# Altium schematic symbol library 6-Connectors 连接器.端子.SchLib: 402 symbols (part 2 of 5) (continued)
## Connector 240 Female (4x60) + 3x4 GND (continued)
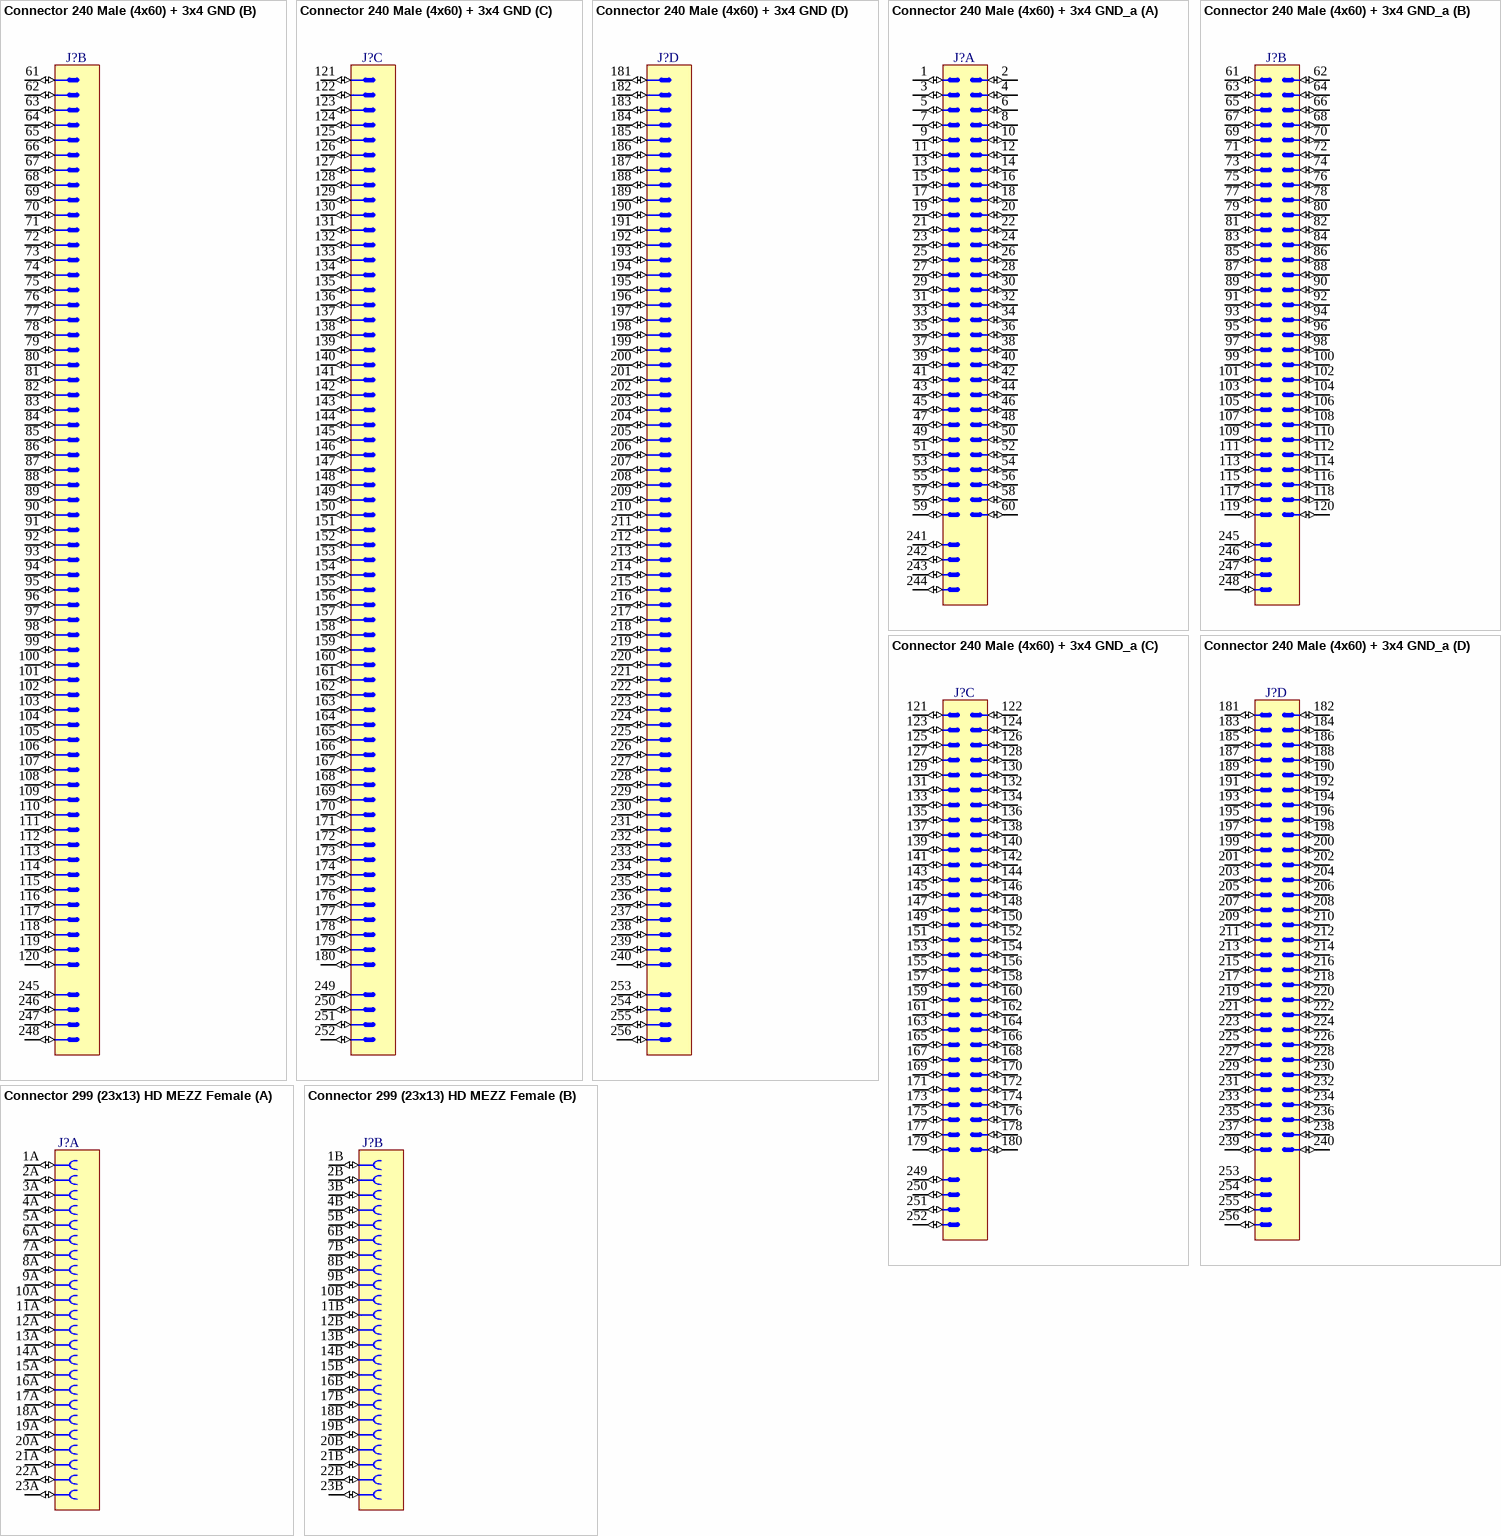
[diagram p20: symbols Connector 240 Male (4x60) + 3x4 GND to Connector 299 (23x13) HD MEZZ Female]

## Connector 240 Male (4x60) + 3x4 GND
designator J?
Connector 240 Male (4x60) + 3x4 GND
part A pins: 1 (io), 2 (io), 3 (io), 4 (io), 5 (io), 6 (io), 7 (io), 8 (io), 9 (io), 10 (io), 11 (io), 12 (io), 13 (io), 14 (io), 15 (io), 16 (io), 17 (io), 18 (io), 19 (io), 20 (io), 21 (io), 22 (io), 23 (io), 24 (io), 25 (io), 26 (io), 27 (io), 28 (io), 29 (io), 30 (io), 31 (io), 32 (io), 33 (io), 34 (io), 35 (io), 36 (io), 37 (io), 38 (io), 39 (io), 40 (io), 41 (io), 42 (io), 43 (io), 44 (io), 45 (io), 46 (io), 47 (io), 48 (io), 49 (io), 50 (io), 51 (io), 52 (io), 53 (io), 54 (io), 55 (io), 56 (io), 57 (io), 58 (io), 59 (io), 60 (io), 241 (io), 242 (io), 243 (io), 244 (io)
part B pins: 61 (io), 62 (io), 63 (io), 64 (io), 65 (io), 66 (io), 67 (io), 68 (io), 69 (io), 70 (io), 71 (io), 72 (io), 73 (io), 74 (io), 75 (io), 76 (io), 77 (io), 78 (io), 79 (io), 80 (io), 81 (io), 82 (io), 83 (io), 84 (io), 85 (io), 86 (io), 87 (io), 88 (io), 89 (io), 90 (io), 91 (io), 92 (io), 93 (io), 94 (io), 95 (io), 96 (io), 97 (io), 98 (io), 99 (io), 100 (io), 101 (io), 102 (io), 103 (io), 104 (io), 105 (io), 106 (io), 107 (io), 108 (io), 109 (io), 110 (io), 111 (io), 112 (io), 113 (io), 114 (io), 115 (io), 116 (io), 117 (io), 118 (io), 119 (io), 120 (io), 245 (io), 246 (io), 247 (io), 248 (io)
part C pins: 121 (io), 122 (io), 123 (io), 124 (io), 125 (io), 126 (io), 127 (io), 128 (io), 129 (io), 130 (io), 131 (io), 132 (io), 133 (io), 134 (io), 135 (io), 136 (io), 137 (io), 138 (io), 139 (io), 140 (io), 141 (io), 142 (io), 143 (io), 144 (io), 145 (io), 146 (io), 147 (io), 148 (io), 149 (io), 150 (io), 151 (io), 152 (io), 153 (io), 154 (io), 155 (io), 156 (io), 157 (io), 158 (io), 159 (io), 160 (io), 161 (io), 162 (io), 163 (io), 164 (io), 165 (io), 166 (io), 167 (io), 168 (io), 169 (io), 170 (io), 171 (io), 172 (io), 173 (io), 174 (io), 175 (io), 176 (io), 177 (io), 178 (io), 179 (io), 180 (io), 249 (io), 250 (io), 251 (io), 252 (io)
part D pins: 181 (io), 182 (io), 183 (io), 184 (io), 185 (io), 186 (io), 187 (io), 188 (io), 189 (io), 190 (io), 191 (io), 192 (io), 193 (io), 194 (io), 195 (io), 196 (io), 197 (io), 198 (io), 199 (io), 200 (io), 201 (io), 202 (io), 203 (io), 204 (io), 205 (io), 206 (io), 207 (io), 208 (io), 209 (io), 210 (io), 211 (io), 212 (io), 213 (io), 214 (io), 215 (io), 216 (io), 217 (io), 218 (io), 219 (io), 220 (io), 221 (io), 222 (io), 223 (io), 224 (io), 225 (io), 226 (io), 227 (io), 228 (io), 229 (io), 230 (io), 231 (io), 232 (io), 233 (io), 234 (io), 235 (io), 236 (io), 237 (io), 238 (io), 239 (io), 240 (io), 253 (io), 254 (io), 255 (io), 256 (io)

## Connector 240 Male (4x60) + 3x4 GND_a
designator J?
Connector 240 Male (4x60) + 3x4 GND
part A pins: 1 (io), 2 (io), 3 (io), 4 (io), 5 (io), 6 (io), 7 (io), 8 (io), 9 (io), 10 (io), 11 (io), 12 (io), 13 (io), 14 (io), 15 (io), 16 (io), 17 (io), 18 (io), 19 (io), 20 (io), 21 (io), 22 (io), 23 (io), 24 (io), 25 (io), 26 (io), 27 (io), 28 (io), 29 (io), 30 (io), 31 (io), 32 (io), 33 (io), 34 (io), 35 (io), 36 (io), 37 (io), 38 (io), 39 (io), 40 (io), 41 (io), 42 (io), 43 (io), 44 (io), 45 (io), 46 (io), 47 (io), 48 (io), 49 (io), 50 (io), 51 (io), 52 (io), 53 (io), 54 (io), 55 (io), 56 (io), 57 (io), 58 (io), 59 (io), 60 (io), 241 (io), 242 (io), 243 (io), 244 (io)
part B pins: 61 (io), 62 (io), 63 (io), 64 (io), 65 (io), 66 (io), 67 (io), 68 (io), 69 (io), 70 (io), 71 (io), 72 (io), 73 (io), 74 (io), 75 (io), 76 (io), 77 (io), 78 (io), 79 (io), 80 (io), 81 (io), 82 (io), 83 (io), 84 (io), 85 (io), 86 (io), 87 (io), 88 (io), 89 (io), 90 (io), 91 (io), 92 (io), 93 (io), 94 (io), 95 (io), 96 (io), 97 (io), 98 (io), 99 (io), 100 (io), 101 (io), 102 (io), 103 (io), 104 (io), 105 (io), 106 (io), 107 (io), 108 (io), 109 (io), 110 (io), 111 (io), 112 (io), 113 (io), 114 (io), 115 (io), 116 (io), 117 (io), 118 (io), 119 (io), 120 (io), 245 (io), 246 (io), 247 (io), 248 (io)
part C pins: 121 (io), 122 (io), 123 (io), 124 (io), 125 (io), 126 (io), 127 (io), 128 (io), 129 (io), 130 (io), 131 (io), 132 (io), 133 (io), 134 (io), 135 (io), 136 (io), 137 (io), 138 (io), 139 (io), 140 (io), 141 (io), 142 (io), 143 (io), 144 (io), 145 (io), 146 (io), 147 (io), 148 (io), 149 (io), 150 (io), 151 (io), 152 (io), 153 (io), 154 (io), 155 (io), 156 (io), 157 (io), 158 (io), 159 (io), 160 (io), 161 (io), 162 (io), 163 (io), 164 (io), 165 (io), 166 (io), 167 (io), 168 (io), 169 (io), 170 (io), 171 (io), 172 (io), 173 (io), 174 (io), 175 (io), 176 (io), 177 (io), 178 (io), 179 (io), 180 (io), 249 (io), 250 (io), 251 (io), 252 (io)
part D pins: 181 (io), 182 (io), 183 (io), 184 (io), 185 (io), 186 (io), 187 (io), 188 (io), 189 (io), 190 (io), 191 (io), 192 (io), 193 (io), 194 (io), 195 (io), 196 (io), 197 (io), 198 (io), 199 (io), 200 (io), 201 (io), 202 (io), 203 (io), 204 (io), 205 (io), 206 (io), 207 (io), 208 (io), 209 (io), 210 (io), 211 (io), 212 (io), 213 (io), 214 (io), 215 (io), 216 (io), 217 (io), 218 (io), 219 (io), 220 (io), 221 (io), 222 (io), 223 (io), 224 (io), 225 (io), 226 (io), 227 (io), 228 (io), 229 (io), 230 (io), 231 (io), 232 (io), 233 (io), 234 (io), 235 (io), 236 (io), 237 (io), 238 (io), 239 (io), 240 (io), 253 (io), 254 (io), 255 (io), 256 (io)

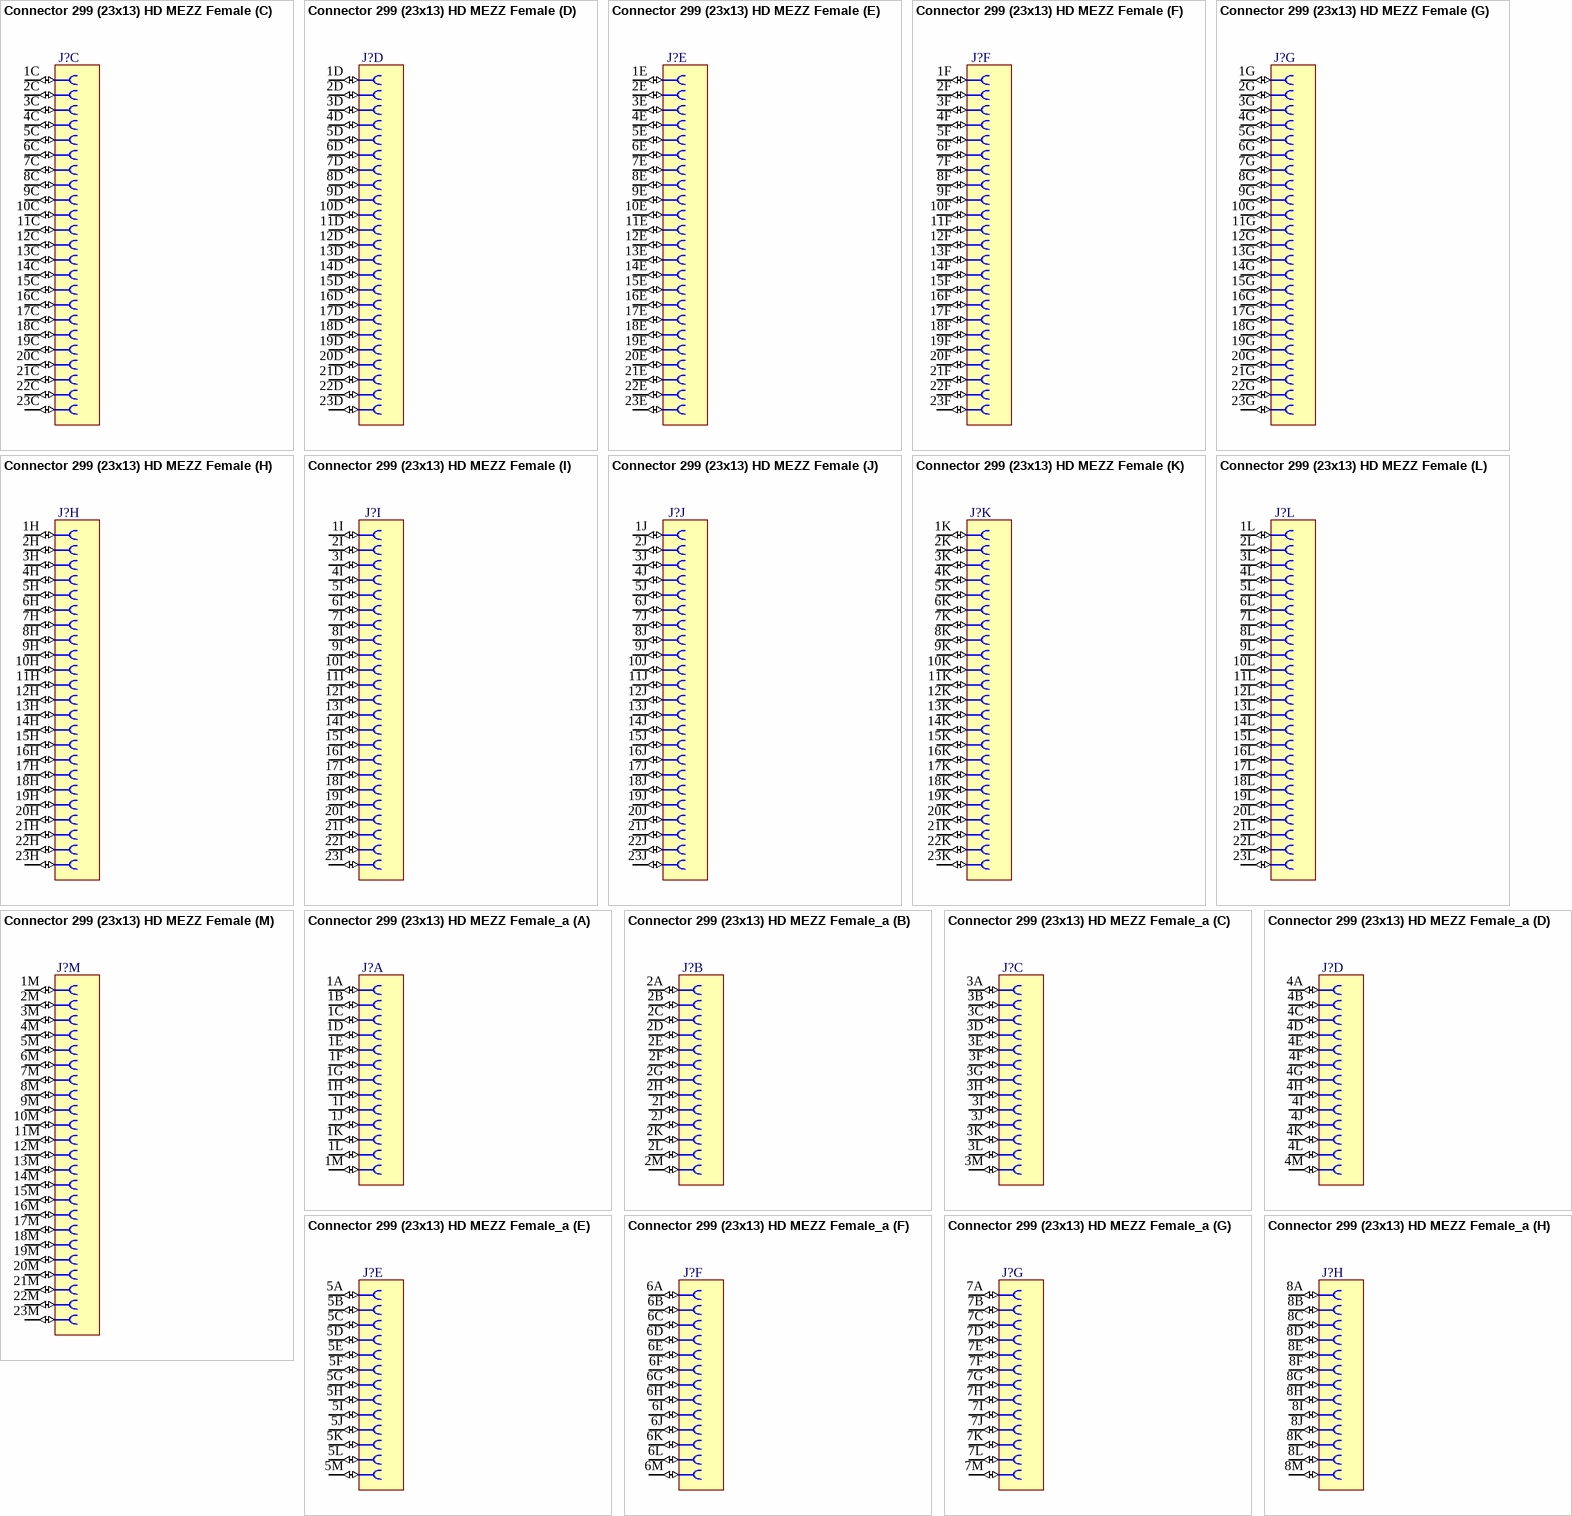
[diagram p21: symbols Connector 299 (23x13) HD MEZZ Female to Connector 299 (23x13) HD MEZZ Female_a]

## Connector 299 (23x13) HD MEZZ Female
designator J?
299 Contacts (23 Row  x 13 Column (A to M) HD MEZZ Female Connector
part A pins: 1A (io), 2A (io), 3A (io), 4A (io), 5A (io), 6A (io), 7A (io), 8A (io), 9A (io), 10A (io), 11A (io), 12A (io), 13A (io), 14A (io), 15A (io), 16A (io), 17A (io), 18A (io), 19A (io), 20A (io), 21A (io), 22A (io), 23A (io)
part B pins: 1B (io), 2B (io), 3B (io), 4B (io), 5B (io), 6B (io), 7B (io), 8B (io), 9B (io), 10B (io), 11B (io), 12B (io), 13B (io), 14B (io), 15B (io), 16B (io), 17B (io), 18B (io), 19B (io), 20B (io), 21B (io), 22B (io), 23B (io)
part C pins: 1C (io), 2C (io), 3C (io), 4C (io), 5C (io), 6C (io), 7C (io), 8C (io), 9C (io), 10C (io), 11C (io), 12C (io), 13C (io), 14C (io), 15C (io), 16C (io), 17C (io), 18C (io), 19C (io), 20C (io), 21C (io), 22C (io), 23C (io)
part D pins: 1D (io), 2D (io), 3D (io), 4D (io), 5D (io), 6D (io), 7D (io), 8D (io), 9D (io), 10D (io), 11D (io), 12D (io), 13D (io), 14D (io), 15D (io), 16D (io), 17D (io), 18D (io), 19D (io), 20D (io), 21D (io), 22D (io), 23D (io)
part E pins: 1E (io), 2E (io), 3E (io), 4E (io), 5E (io), 6E (io), 7E (io), 8E (io), 9E (io), 10E (io), 11E (io), 12E (io), 13E (io), 14E (io), 15E (io), 16E (io), 17E (io), 18E (io), 19E (io), 20E (io), 21E (io), 22E (io), 23E (io)
part F pins: 1F (io), 2F (io), 3F (io), 4F (io), 5F (io), 6F (io), 7F (io), 8F (io), 9F (io), 10F (io), 11F (io), 12F (io), 13F (io), 14F (io), 15F (io), 16F (io), 17F (io), 18F (io), 19F (io), 20F (io), 21F (io), 22F (io), 23F (io)
part G pins: 1G (io), 2G (io), 3G (io), 4G (io), 5G (io), 6G (io), 7G (io), 8G (io), 9G (io), 10G (io), 11G (io), 12G (io), 13G (io), 14G (io), 15G (io), 16G (io), 17G (io), 18G (io), 19G (io), 20G (io), 21G (io), 22G (io), 23G (io)
part H pins: 1H (io), 2H (io), 3H (io), 4H (io), 5H (io), 6H (io), 7H (io), 8H (io), 9H (io), 10H (io), 11H (io), 12H (io), 13H (io), 14H (io), 15H (io), 16H (io), 17H (io), 18H (io), 19H (io), 20H (io), 21H (io), 22H (io), 23H (io)
part I pins: 1I (io), 2I (io), 3I (io), 4I (io), 5I (io), 6I (io), 7I (io), 8I (io), 9I (io), 10I (io), 11I (io), 12I (io), 13I (io), 14I (io), 15I (io), 16I (io), 17I (io), 18I (io), 19I (io), 20I (io), 21I (io), 22I (io), 23I (io)
part J pins: 1J (io), 2J (io), 3J (io), 4J (io), 5J (io), 6J (io), 7J (io), 8J (io), 9J (io), 10J (io), 11J (io), 12J (io), 13J (io), 14J (io), 15J (io), 16J (io), 17J (io), 18J (io), 19J (io), 20J (io), 21J (io), 22J (io), 23J (io)
part K pins: 1K (io), 2K (io), 3K (io), 4K (io), 5K (io), 6K (io), 7K (io), 8K (io), 9K (io), 10K (io), 11K (io), 12K (io), 13K (io), 14K (io), 15K (io), 16K (io), 17K (io), 18K (io), 19K (io), 20K (io), 21K (io), 22K (io), 23K (io)
part L pins: 1L (io), 2L (io), 3L (io), 4L (io), 5L (io), 6L (io), 7L (io), 8L (io), 9L (io), 10L (io), 11L (io), 12L (io), 13L (io), 14L (io), 15L (io), 16L (io), 17L (io), 18L (io), 19L (io), 20L (io), 21L (io), 22L (io), 23L (io)
part M pins: 1M (io), 2M (io), 3M (io), 4M (io), 5M (io), 6M (io), 7M (io), 8M (io), 9M (io), 10M (io), 11M (io), 12M (io), 13M (io), 14M (io), 15M (io), 16M (io), 17M (io), 18M (io), 19M (io), 20M (io), 21M (io), 22M (io), 23M (io)

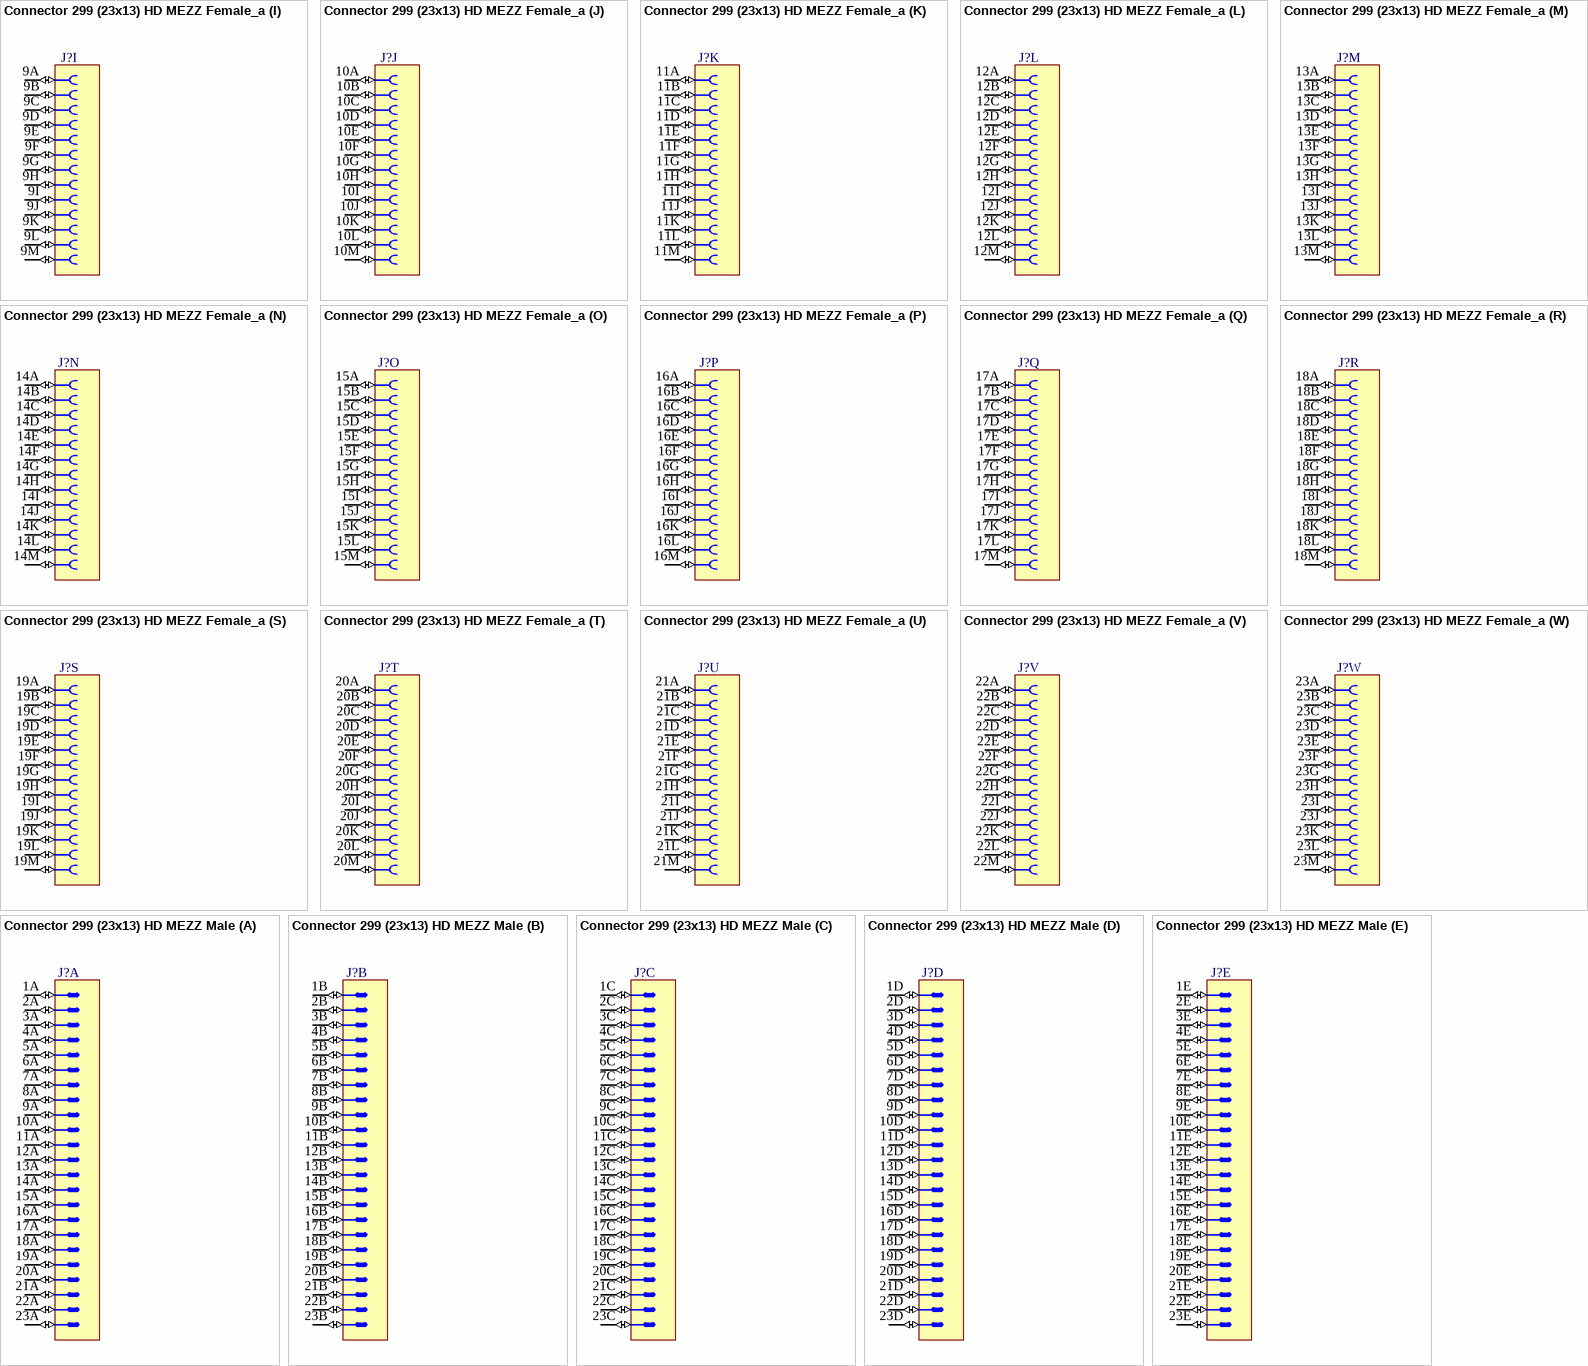
[diagram p22: symbols Connector 299 (23x13) HD MEZZ Female_a to Connector 299 (23x13) HD MEZZ Male]

## Connector 299 (23x13) HD MEZZ Female_a
designator J?
299 Contacts (23 Row  x 13 Column (A to M) HD MEZZ Female Connector
part A pins: 1A (io), 1B (io), 1C (io), 1D (io), 1E (io), 1F (io), 1G (io), 1H (io), 1I (io), 1J (io), 1K (io), 1L (io), 1M (io)
part B pins: 2A (io), 2B (io), 2C (io), 2D (io), 2E (io), 2F (io), 2G (io), 2H (io), 2I (io), 2J (io), 2K (io), 2L (io), 2M (io)
part C pins: 3A (io), 3B (io), 3C (io), 3D (io), 3E (io), 3F (io), 3G (io), 3H (io), 3I (io), 3J (io), 3K (io), 3L (io), 3M (io)
part D pins: 4A (io), 4B (io), 4C (io), 4D (io), 4E (io), 4F (io), 4G (io), 4H (io), 4I (io), 4J (io), 4K (io), 4L (io), 4M (io)
part E pins: 5A (io), 5B (io), 5C (io), 5D (io), 5E (io), 5F (io), 5G (io), 5H (io), 5I (io), 5J (io), 5K (io), 5L (io), 5M (io)
part F pins: 6A (io), 6B (io), 6C (io), 6D (io), 6E (io), 6F (io), 6G (io), 6H (io), 6I (io), 6J (io), 6K (io), 6L (io), 6M (io)
part G pins: 7A (io), 7B (io), 7C (io), 7D (io), 7E (io), 7F (io), 7G (io), 7H (io), 7I (io), 7J (io), 7K (io), 7L (io), 7M (io)
part H pins: 8A (io), 8B (io), 8C (io), 8D (io), 8E (io), 8F (io), 8G (io), 8H (io), 8I (io), 8J (io), 8K (io), 8L (io), 8M (io)
part I pins: 9A (io), 9B (io), 9C (io), 9D (io), 9E (io), 9F (io), 9G (io), 9H (io), 9I (io), 9J (io), 9K (io), 9L (io), 9M (io)
part J pins: 10A (io), 10B (io), 10C (io), 10D (io), 10E (io), 10F (io), 10G (io), 10H (io), 10I (io), 10J (io), 10K (io), 10L (io), 10M (io)
part K pins: 11A (io), 11B (io), 11C (io), 11D (io), 11E (io), 11F (io), 11G (io), 11H (io), 11I (io), 11J (io), 11K (io), 11L (io), 11M (io)
part L pins: 12A (io), 12B (io), 12C (io), 12D (io), 12E (io), 12F (io), 12G (io), 12H (io), 12I (io), 12J (io), 12K (io), 12L (io), 12M (io)
part M pins: 13A (io), 13B (io), 13C (io), 13D (io), 13E (io), 13F (io), 13G (io), 13H (io), 13I (io), 13J (io), 13K (io), 13L (io), 13M (io)
part N pins: 14A (io), 14B (io), 14C (io), 14D (io), 14E (io), 14F (io), 14G (io), 14H (io), 14I (io), 14J (io), 14K (io), 14L (io), 14M (io)
part O pins: 15A (io), 15B (io), 15C (io), 15D (io), 15E (io), 15F (io), 15G (io), 15H (io), 15I (io), 15J (io), 15K (io), 15L (io), 15M (io)
part P pins: 16A (io), 16B (io), 16C (io), 16D (io), 16E (io), 16F (io), 16G (io), 16H (io), 16I (io), 16J (io), 16K (io), 16L (io), 16M (io)
part Q pins: 17A (io), 17B (io), 17C (io), 17D (io), 17E (io), 17F (io), 17G (io), 17H (io), 17I (io), 17J (io), 17K (io), 17L (io), 17M (io)
part R pins: 18A (io), 18B (io), 18C (io), 18D (io), 18E (io), 18F (io), 18G (io), 18H (io), 18I (io), 18J (io), 18K (io), 18L (io), 18M (io)
part S pins: 19A (io), 19B (io), 19C (io), 19D (io), 19E (io), 19F (io), 19G (io), 19H (io), 19I (io), 19J (io), 19K (io), 19L (io), 19M (io)
part T pins: 20A (io), 20B (io), 20C (io), 20D (io), 20E (io), 20F (io), 20G (io), 20H (io), 20I (io), 20J (io), 20K (io), 20L (io), 20M (io)
part U pins: 21A (io), 21B (io), 21C (io), 21D (io), 21E (io), 21F (io), 21G (io), 21H (io), 21I (io), 21J (io), 21K (io), 21L (io), 21M (io)
part V pins: 22A (io), 22B (io), 22C (io), 22D (io), 22E (io), 22F (io), 22G (io), 22H (io), 22I (io), 22J (io), 22K (io), 22L (io), 22M (io)
part W pins: 23A (io), 23B (io), 23C (io), 23D (io), 23E (io), 23F (io), 23G (io), 23H (io), 23I (io), 23J (io), 23K (io), 23L (io), 23M (io)

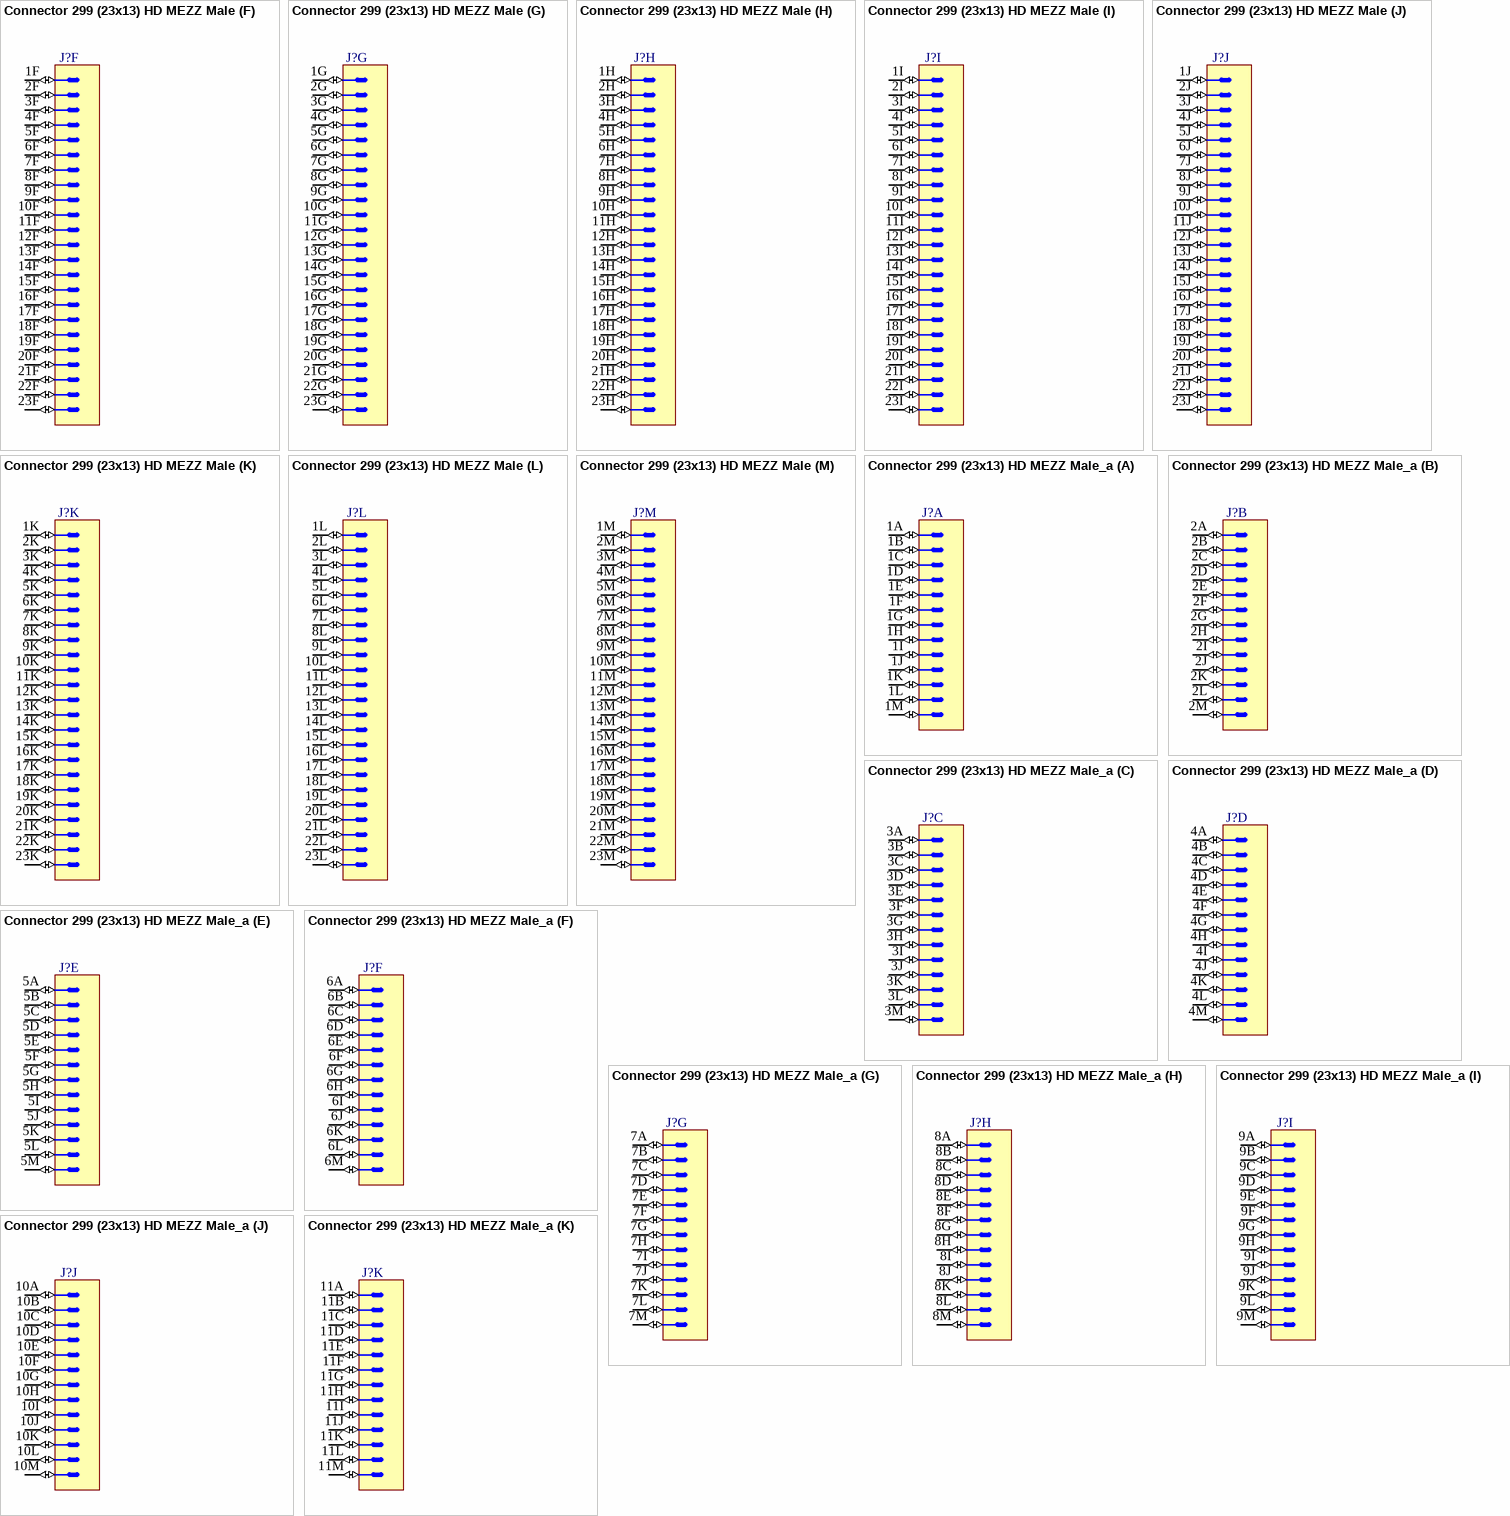
[diagram p23: symbols Connector 299 (23x13) HD MEZZ Male to Connector 299 (23x13) HD MEZZ Male_a]

## Connector 299 (23x13) HD MEZZ Male
designator J?
299 Contacts (23 Row  x 13 Column (A to M) HD MEZZ Male Connector
part A pins: 1A (io), 2A (io), 3A (io), 4A (io), 5A (io), 6A (io), 7A (io), 8A (io), 9A (io), 10A (io), 11A (io), 12A (io), 13A (io), 14A (io), 15A (io), 16A (io), 17A (io), 18A (io), 19A (io), 20A (io), 21A (io), 22A (io), 23A (io)
part B pins: 1B (io), 2B (io), 3B (io), 4B (io), 5B (io), 6B (io), 7B (io), 8B (io), 9B (io), 10B (io), 11B (io), 12B (io), 13B (io), 14B (io), 15B (io), 16B (io), 17B (io), 18B (io), 19B (io), 20B (io), 21B (io), 22B (io), 23B (io)
part C pins: 1C (io), 2C (io), 3C (io), 4C (io), 5C (io), 6C (io), 7C (io), 8C (io), 9C (io), 10C (io), 11C (io), 12C (io), 13C (io), 14C (io), 15C (io), 16C (io), 17C (io), 18C (io), 19C (io), 20C (io), 21C (io), 22C (io), 23C (io)
part D pins: 1D (io), 2D (io), 3D (io), 4D (io), 5D (io), 6D (io), 7D (io), 8D (io), 9D (io), 10D (io), 11D (io), 12D (io), 13D (io), 14D (io), 15D (io), 16D (io), 17D (io), 18D (io), 19D (io), 20D (io), 21D (io), 22D (io), 23D (io)
part E pins: 1E (io), 2E (io), 3E (io), 4E (io), 5E (io), 6E (io), 7E (io), 8E (io), 9E (io), 10E (io), 11E (io), 12E (io), 13E (io), 14E (io), 15E (io), 16E (io), 17E (io), 18E (io), 19E (io), 20E (io), 21E (io), 22E (io), 23E (io)
part F pins: 1F (io), 2F (io), 3F (io), 4F (io), 5F (io), 6F (io), 7F (io), 8F (io), 9F (io), 10F (io), 11F (io), 12F (io), 13F (io), 14F (io), 15F (io), 16F (io), 17F (io), 18F (io), 19F (io), 20F (io), 21F (io), 22F (io), 23F (io)
part G pins: 1G (io), 2G (io), 3G (io), 4G (io), 5G (io), 6G (io), 7G (io), 8G (io), 9G (io), 10G (io), 11G (io), 12G (io), 13G (io), 14G (io), 15G (io), 16G (io), 17G (io), 18G (io), 19G (io), 20G (io), 21G (io), 22G (io), 23G (io)
part H pins: 1H (io), 2H (io), 3H (io), 4H (io), 5H (io), 6H (io), 7H (io), 8H (io), 9H (io), 10H (io), 11H (io), 12H (io), 13H (io), 14H (io), 15H (io), 16H (io), 17H (io), 18H (io), 19H (io), 20H (io), 21H (io), 22H (io), 23H (io)
part I pins: 1I (io), 2I (io), 3I (io), 4I (io), 5I (io), 6I (io), 7I (io), 8I (io), 9I (io), 10I (io), 11I (io), 12I (io), 13I (io), 14I (io), 15I (io), 16I (io), 17I (io), 18I (io), 19I (io), 20I (io), 21I (io), 22I (io), 23I (io)
part J pins: 1J (io), 2J (io), 3J (io), 4J (io), 5J (io), 6J (io), 7J (io), 8J (io), 9J (io), 10J (io), 11J (io), 12J (io), 13J (io), 14J (io), 15J (io), 16J (io), 17J (io), 18J (io), 19J (io), 20J (io), 21J (io), 22J (io), 23J (io)
part K pins: 1K (io), 2K (io), 3K (io), 4K (io), 5K (io), 6K (io), 7K (io), 8K (io), 9K (io), 10K (io), 11K (io), 12K (io), 13K (io), 14K (io), 15K (io), 16K (io), 17K (io), 18K (io), 19K (io), 20K (io), 21K (io), 22K (io), 23K (io)
part L pins: 1L (io), 2L (io), 3L (io), 4L (io), 5L (io), 6L (io), 7L (io), 8L (io), 9L (io), 10L (io), 11L (io), 12L (io), 13L (io), 14L (io), 15L (io), 16L (io), 17L (io), 18L (io), 19L (io), 20L (io), 21L (io), 22L (io), 23L (io)
part M pins: 1M (io), 2M (io), 3M (io), 4M (io), 5M (io), 6M (io), 7M (io), 8M (io), 9M (io), 10M (io), 11M (io), 12M (io), 13M (io), 14M (io), 15M (io), 16M (io), 17M (io), 18M (io), 19M (io), 20M (io), 21M (io), 22M (io), 23M (io)

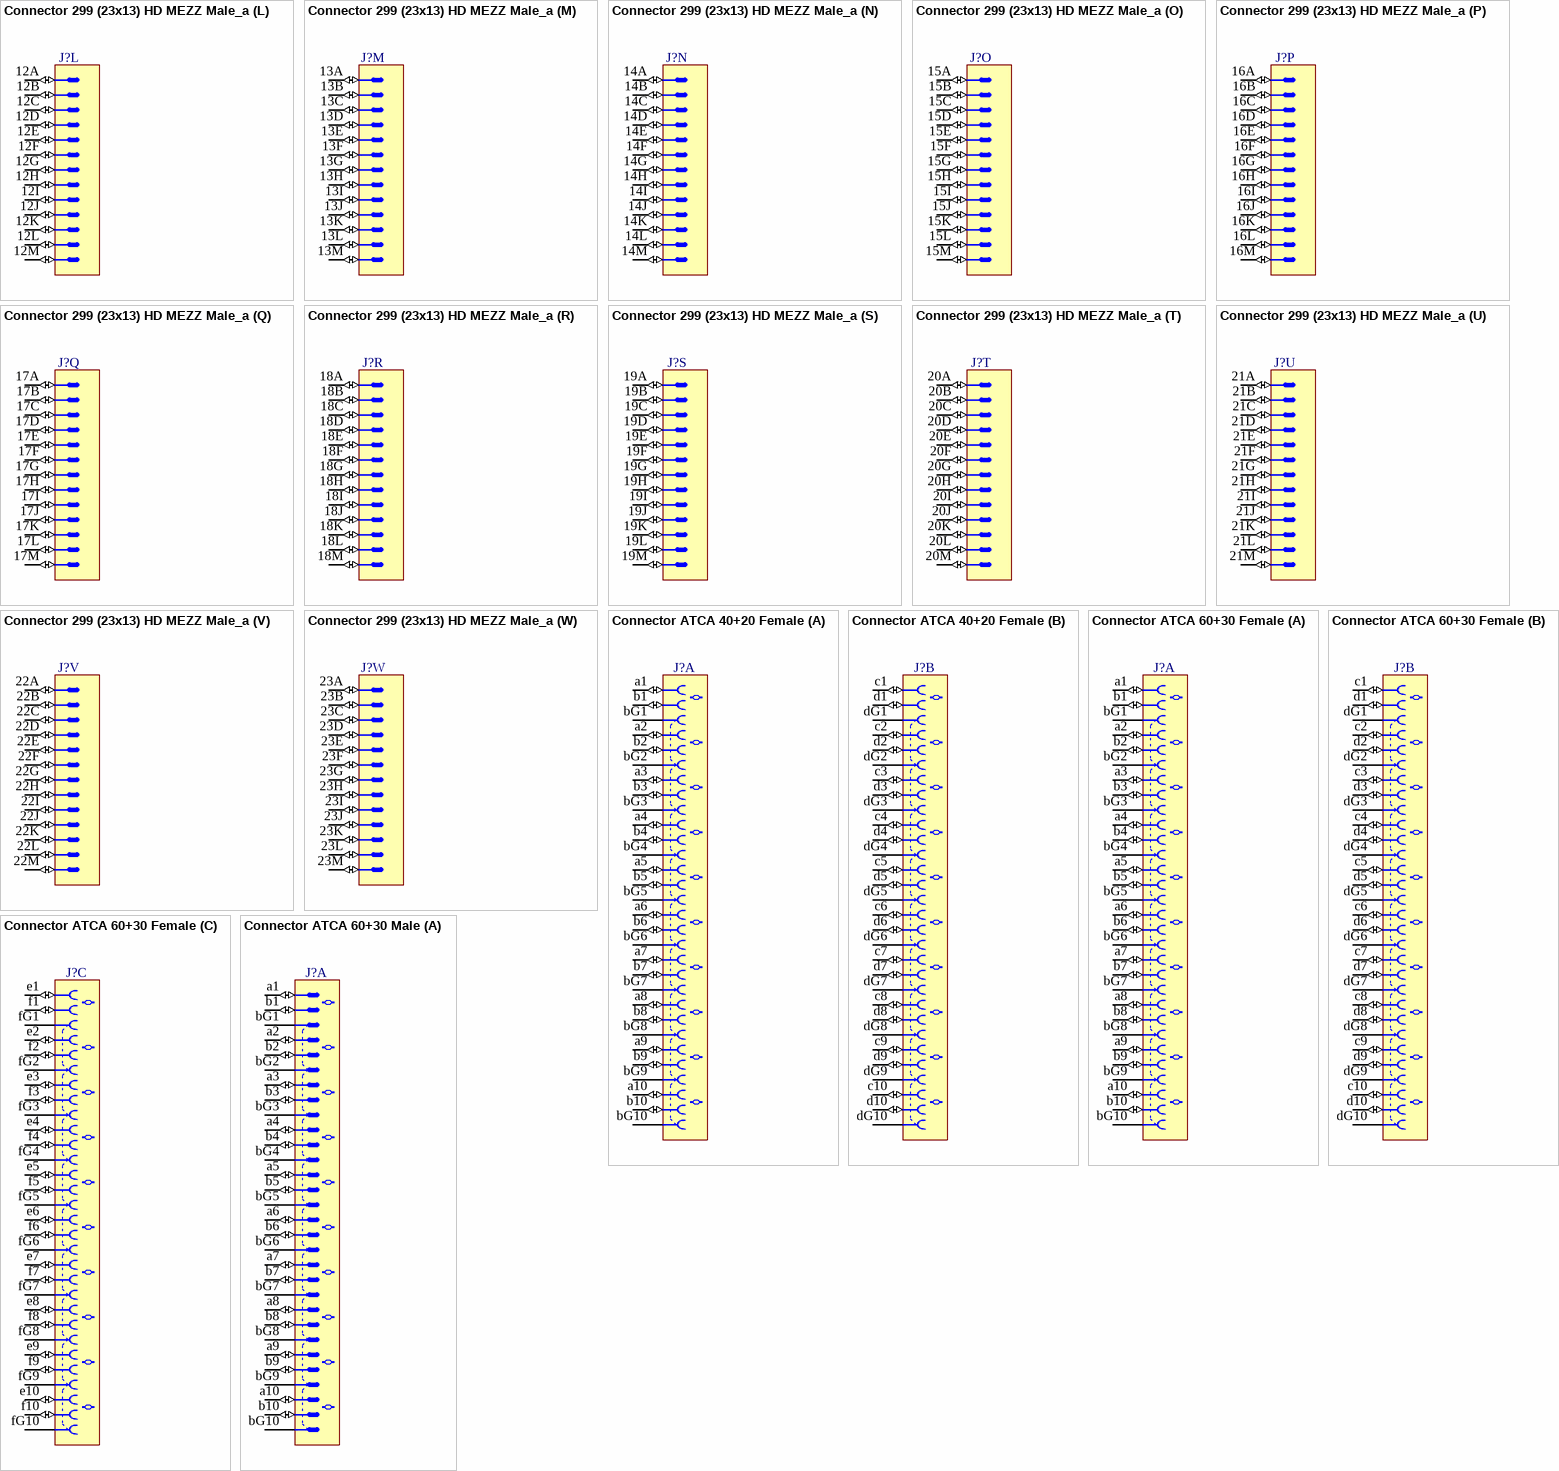
[diagram p24: symbols Connector 299 (23x13) HD MEZZ Male_a to Connector ATCA 60+30 Male]